# Altium schematic symbol library Kondensator_DIP.SchLib: 1521 symbols (part 2 of 4) (continued)
## Ê50-29-100Â-33ÌÊÔ
designator C?  (value not drawn)
Value: *
footprint K50-29(0820)
pins: 1, 2

## Ê50-29-100Â-47ÌÊÔ
designator C?  (value not drawn)
Value: *
footprint K50-29(1021)
pins: 1, 2

## Ê50-29-100Â-220ÌÊÔ
designator C?  (value not drawn)
Value: *
footprint K50-29(1628)
pins: 1, 2

## Ê50-29-100Â-330ÌÊÔ
designator C?  (value not drawn)
Value: *
footprint K50-29(1633)
pins: 1, 2

## Ê50-29-100Â-470ÌÊÔ
designator C?  (value not drawn)
Value: *
footprint K50-29(1836)
pins: 1, 2

## Ê50-29-160Â-0,47ÌÊÔ
designator C?  (value not drawn)
Value: *
footprint K50-29(0613)
pins: 1, 2

## Ê50-29-160Â-1,0ÌÊÔ
designator C?  (value not drawn)
Value: *
footprint K50-29(0613)
pins: 1, 2

## Ê50-29-160Â-2,2ÌÊÔ
designator C?  (value not drawn)
Value: *
footprint K50-29(0816)
pins: 1, 2

## Ê50-29-160Â-3,3ÌÊÔ
designator C?  (value not drawn)
Value: *
footprint K50-29(0816)
pins: 1, 2

## Ê50-29-160Â-4,7ÌÊÔ
designator C?  (value not drawn)
Value: *
footprint K50-29(0816)
pins: 1, 2

## Ê50-29-160Â-10ÌÊÔ
designator C?  (value not drawn)
Value: *
footprint K50-29(1021)
pins: 1, 2

## Ê50-29-160Â-47ÌÊÔ
designator C?  (value not drawn)
Value: *
footprint K50-29(1628)
pins: 1, 2

## Ê50-29-160Â-100ÌÊÔ
designator C?  (value not drawn)
Value: *
footprint K50-29(1633)
pins: 1, 2

## Ê50-29-160Â-220ÌÊÔ
designator C?  (value not drawn)
Value: *
footprint K50-29(2242)
pins: 1, 2

## Ê50-29-160Â-330ÌÊÔ
designator C?  (value not drawn)
Value: *
footprint K50-29(2250)
pins: 1, 2

## Ê50-29-200Â-0,47ÌÊÔ
designator C?  (value not drawn)
Value: *
footprint K50-29(0816)
pins: 1, 2

## Ê50-29-200Â-1,0ÌÊÔ
designator C?  (value not drawn)
Value: *
footprint K50-29(0816)
pins: 1, 2

## Ê50-29-200Â-2,2ÌÊÔ
designator C?  (value not drawn)
Value: *
footprint K50-29(0816)
pins: 1, 2

## Ê50-29-200Â-3,3ÌÊÔ
designator C?  (value not drawn)
Value: *
footprint K50-29(1016)
pins: 1, 2

## Ê50-29-200Â-4,7ÌÊÔ
designator C?  (value not drawn)
Value: *
footprint K50-29(1016)
pins: 1, 2

## Ê50-29-200Â-10ÌÊÔ
designator C?  (value not drawn)
Value: *
footprint K50-29(1021)
pins: 1, 2

## Ê50-29-200Â-33ÌÊÔ
designator C?  (value not drawn)
Value: *
footprint K50-29(1628)
pins: 1, 2

## Ê50-29-200Â-47ÌÊÔ
designator C?  (value not drawn)
Value: *
footprint K50-29(1633)
pins: 1, 2

## Ê50-29-200Â-100ÌÊÔ
designator C?  (value not drawn)
Value: *
footprint K50-29(1836)
pins: 1, 2

## Ê50-29-200Â-220ÌÊÔ
designator C?  (value not drawn)
Value: *
footprint K50-29(2242)
pins: 1, 2

## Ê50-29-200Â-330ÌÊÔ
designator C?  (value not drawn)
Value: *
footprint K50-29(2552)
pins: 1, 2

## Ê50-29-250Â-0,47ÌÊÔ
designator C?  (value not drawn)
Value: *
footprint K50-29(0816)
pins: 1, 2

## Ê50-29-250Â-1,0ÌÊÔ
designator C?  (value not drawn)
Value: *
footprint K50-29(0816)
pins: 1, 2

## Ê50-29-250Â-2,2ÌÊÔ
designator C?  (value not drawn)
Value: *
footprint K50-29(0816)
pins: 1, 2

## Ê50-29-250Â-3,3ÌÊÔ
designator C?  (value not drawn)
Value: *
footprint K50-29(1016)
pins: 1, 2

## Ê50-29-250Â-4,7ÌÊÔ
designator C?  (value not drawn)
Value: *
footprint K50-29(1016)
pins: 1, 2

## Ê50-29-250Â-10ÌÊÔ
designator C?  (value not drawn)
Value: *
footprint K50-29(1021)
pins: 1, 2

## Ê50-29-250Â-22ÌÊÔ
designator C?  (value not drawn)
Value: *
footprint K50-29(1326)
pins: 1, 2

## Ê50-29-250Â-33ÌÊÔ
designator C?  (value not drawn)
Value: *
footprint K50-29(1633)
pins: 1, 2

## Ê50-29-250Â-47ÌÊÔ
designator C?  (value not drawn)
Value: *
footprint K50-29(1633)
pins: 1, 2

## Ê50-29-250Â-100ÌÊÔ
designator C?  (value not drawn)
Value: *
footprint K50-29(1836)
pins: 1, 2

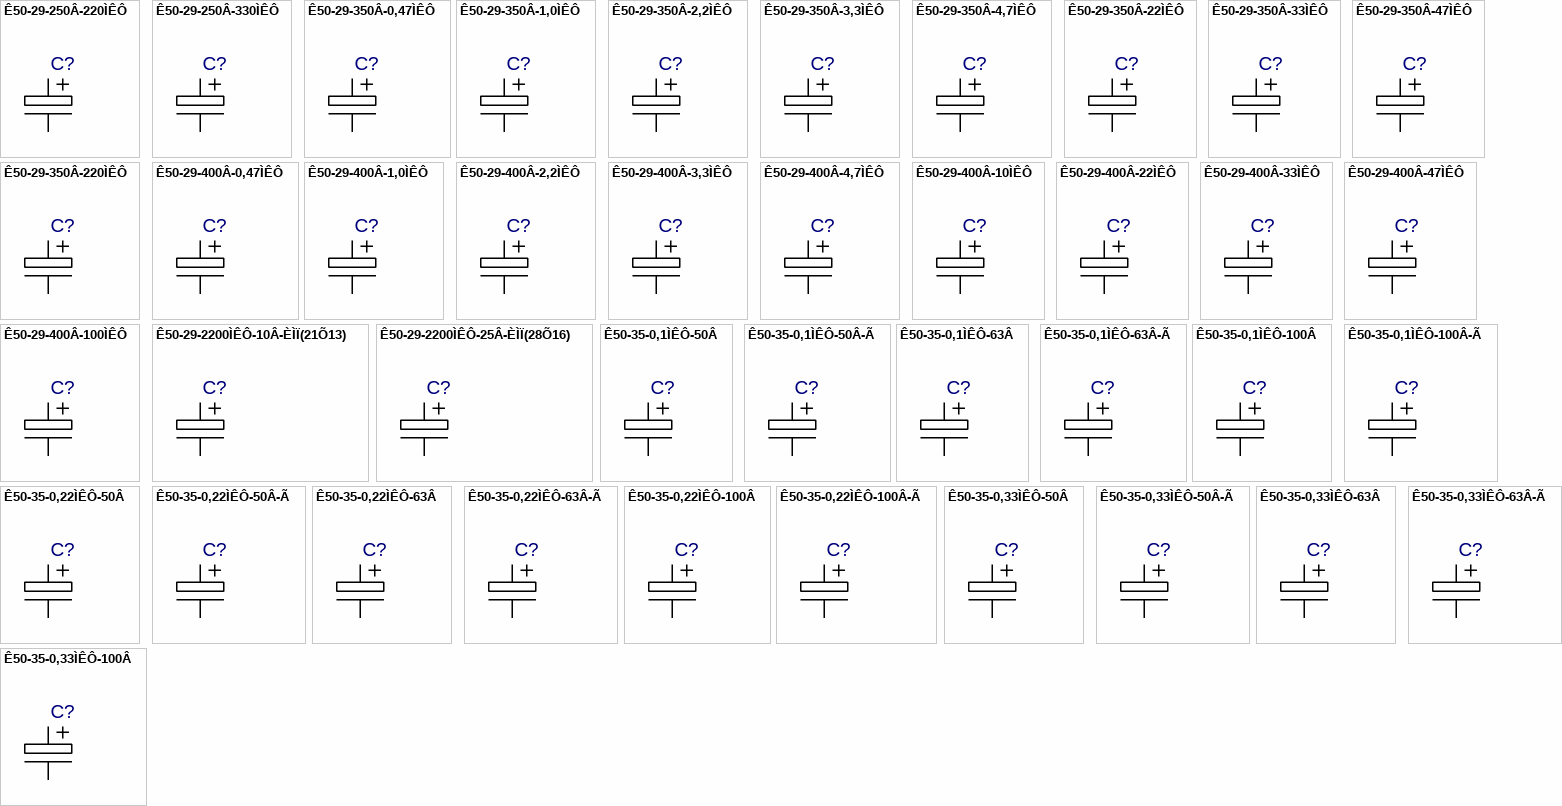
[diagram p20: symbols Ê50-29-250Â-220ÌÊÔ to Ê50-35-0,33ÌÊÔ-100Â]

## Ê50-29-250Â-220ÌÊÔ
designator C?  (value not drawn)
Value: *
footprint K50-29(2242)
pins: 1, 2

## Ê50-29-250Â-330ÌÊÔ
designator C?  (value not drawn)
Value: *
footprint K50-29(2557)
pins: 1, 2

## Ê50-29-350Â-0,47ÌÊÔ
designator C?  (value not drawn)
Value: *
footprint K50-29(0816)
pins: 1, 2

## Ê50-29-350Â-1,0ÌÊÔ
designator C?  (value not drawn)
Value: *
footprint K50-29(0816)
pins: 1, 2

## Ê50-29-350Â-2,2ÌÊÔ
designator C?  (value not drawn)
Value: *
footprint K50-29(1016)
pins: 1, 2

## Ê50-29-350Â-3,3ÌÊÔ
designator C?  (value not drawn)
Value: *
footprint K50-29(1016)
pins: 1, 2

## Ê50-29-350Â-4,7ÌÊÔ
designator C?  (value not drawn)
Value: *
footprint K50-29(1021)
pins: 1, 2

## Ê50-29-350Â-22ÌÊÔ
designator C?  (value not drawn)
Value: *
footprint K50-29(1633)
pins: 1, 2

## Ê50-29-350Â-33ÌÊÔ
designator C?  (value not drawn)
Value: *
footprint K50-29(1633)
pins: 1, 2

## Ê50-29-350Â-47ÌÊÔ
designator C?  (value not drawn)
Value: *
footprint K50-29(1636)
pins: 1, 2

## Ê50-29-350Â-220ÌÊÔ
designator C?  (value not drawn)
Value: *
footprint K50-29(2557)
pins: 1, 2

## Ê50-29-400Â-0,47ÌÊÔ
designator C?  (value not drawn)
Value: *
footprint K50-29(0816)
pins: 1, 2

## Ê50-29-400Â-1,0ÌÊÔ
designator C?  (value not drawn)
Value: *
footprint K50-29(0816)
pins: 1, 2

## Ê50-29-400Â-2,2ÌÊÔ
designator C?  (value not drawn)
Value: *
footprint K50-29(1016)
pins: 1, 2

## Ê50-29-400Â-3,3ÌÊÔ
designator C?  (value not drawn)
Value: *
footprint K50-29(1021)
pins: 1, 2

## Ê50-29-400Â-4,7ÌÊÔ
designator C?  (value not drawn)
Value: *
footprint K50-29(1321)
pins: 1, 2

## Ê50-29-400Â-10ÌÊÔ
designator C?  (value not drawn)
Value: *
footprint K50-29(1324)
pins: 1, 2

## Ê50-29-400Â-22ÌÊÔ
designator C?  (value not drawn)
Value: *
footprint K50-29(1633)
pins: 1, 2

## Ê50-29-400Â-33ÌÊÔ
designator C?  (value not drawn)
Value: *
footprint K50-29(1836)
pins: 1, 2

## Ê50-29-400Â-47ÌÊÔ
designator C?  (value not drawn)
Value: *
footprint K50-29(1836)
pins: 1, 2

## Ê50-29-400Â-100ÌÊÔ
designator C?  (value not drawn)
Value: *
footprint K50-29(2242)
pins: 1, 2

## Ê50-29-2200ÌÊÔ-10Â-ÈÌÏ(21Õ13)
designator C?  (value not drawn)
Value: *
footprint Ê50-29-21Õ13
pins: 1, 2

## Ê50-29-2200ÌÊÔ-25Â-ÈÌÏ(28Õ16)
designator C?  (value not drawn)
Value: *
footprint Ê50-29-28Õ16
pins: 1, 2

## Ê50-35-0,1ÌÊÔ-50Â
designator C?  (value not drawn)
Value: *
footprint Ê50-35-0511_K5035-1R
footprint Ê50-35-0511_K5035-1R1
footprint Ê50-35-0511_Primary
pins: 1, 2

## Ê50-35-0,1ÌÊÔ-50Â-Ã
designator C?  (value not drawn)
Value: *
footprint Ê50-35-0511-Ã_K5035-1R
footprint Ê50-35-0511-Ã_K5035-1R1
footprint Ê50-35-0511-Ã_Primary
pins: 1, 2

## Ê50-35-0,1ÌÊÔ-63Â
designator C?  (value not drawn)
Value: *
footprint Ê50-35-0511_K5035-1R
footprint Ê50-35-0511_K5035-1R1
footprint Ê50-35-0511_Primary
pins: 1, 2

## Ê50-35-0,1ÌÊÔ-63Â-Ã
designator C?  (value not drawn)
Value: *
footprint Ê50-35-0511-Ã_K5035-1R
footprint Ê50-35-0511-Ã_K5035-1R1
footprint Ê50-35-0511-Ã_Primary
pins: 1, 2

## Ê50-35-0,1ÌÊÔ-100Â
designator C?  (value not drawn)
Value: *
footprint Ê50-35-0511_K5035-1R
footprint Ê50-35-0511_K5035-1R1
footprint Ê50-35-0511_Primary
pins: 1, 2

## Ê50-35-0,1ÌÊÔ-100Â-Ã
designator C?  (value not drawn)
Value: *
footprint Ê50-35-0511-Ã_K5035-1R
footprint Ê50-35-0511-Ã_K5035-1R1
footprint Ê50-35-0511-Ã_Primary
pins: 1, 2

## Ê50-35-0,22ÌÊÔ-50Â
designator C?  (value not drawn)
Value: *
footprint Ê50-35-0511_K5035-1R
footprint Ê50-35-0511_K5035-1R1
footprint Ê50-35-0511_Primary
pins: 1, 2

## Ê50-35-0,22ÌÊÔ-50Â-Ã
designator C?  (value not drawn)
Value: *
footprint Ê50-35-0511-Ã_K5035-1R
footprint Ê50-35-0511-Ã_K5035-1R1
footprint Ê50-35-0511-Ã_Primary
pins: 1, 2

## Ê50-35-0,22ÌÊÔ-63Â
designator C?  (value not drawn)
Value: *
footprint Ê50-35-0511_K5035-1R
footprint Ê50-35-0511_K5035-1R1
footprint Ê50-35-0511_Primary
pins: 1, 2

## Ê50-35-0,22ÌÊÔ-63Â-Ã
designator C?  (value not drawn)
Value: *
footprint Ê50-35-0511-Ã_K5035-1R
footprint Ê50-35-0511-Ã_K5035-1R1
footprint Ê50-35-0511-Ã_Primary
pins: 1, 2

## Ê50-35-0,22ÌÊÔ-100Â
designator C?  (value not drawn)
Value: *
footprint Ê50-35-0511_K5035-1R
footprint Ê50-35-0511_K5035-1R1
footprint Ê50-35-0511_Primary
pins: 1, 2

## Ê50-35-0,22ÌÊÔ-100Â-Ã
designator C?  (value not drawn)
Value: *
footprint Ê50-35-0511-Ã_K5035-1R
footprint Ê50-35-0511-Ã_K5035-1R1
footprint Ê50-35-0511-Ã_Primary
pins: 1, 2

## Ê50-35-0,33ÌÊÔ-50Â
designator C?  (value not drawn)
Value: *
footprint Ê50-35-0511_K5035-1R
footprint Ê50-35-0511_K5035-1R1
footprint Ê50-35-0511_Primary
pins: 1, 2

## Ê50-35-0,33ÌÊÔ-50Â-Ã
designator C?  (value not drawn)
Value: *
footprint Ê50-35-0511-Ã_K5035-1R
footprint Ê50-35-0511-Ã_K5035-1R1
footprint Ê50-35-0511-Ã_Primary
pins: 1, 2

## Ê50-35-0,33ÌÊÔ-63Â
designator C?  (value not drawn)
Value: *
footprint Ê50-35-0511_K5035-1R
footprint Ê50-35-0511_K5035-1R1
footprint Ê50-35-0511_Primary
pins: 1, 2

## Ê50-35-0,33ÌÊÔ-63Â-Ã
designator C?  (value not drawn)
Value: *
footprint Ê50-35-0511-Ã_K5035-1R
footprint Ê50-35-0511-Ã_K5035-1R1
footprint Ê50-35-0511-Ã_Primary
pins: 1, 2

## Ê50-35-0,33ÌÊÔ-100Â
designator C?  (value not drawn)
Value: *
footprint Ê50-35-0511_K5035-1R
footprint Ê50-35-0511_K5035-1R1
footprint Ê50-35-0511_Primary
pins: 1, 2

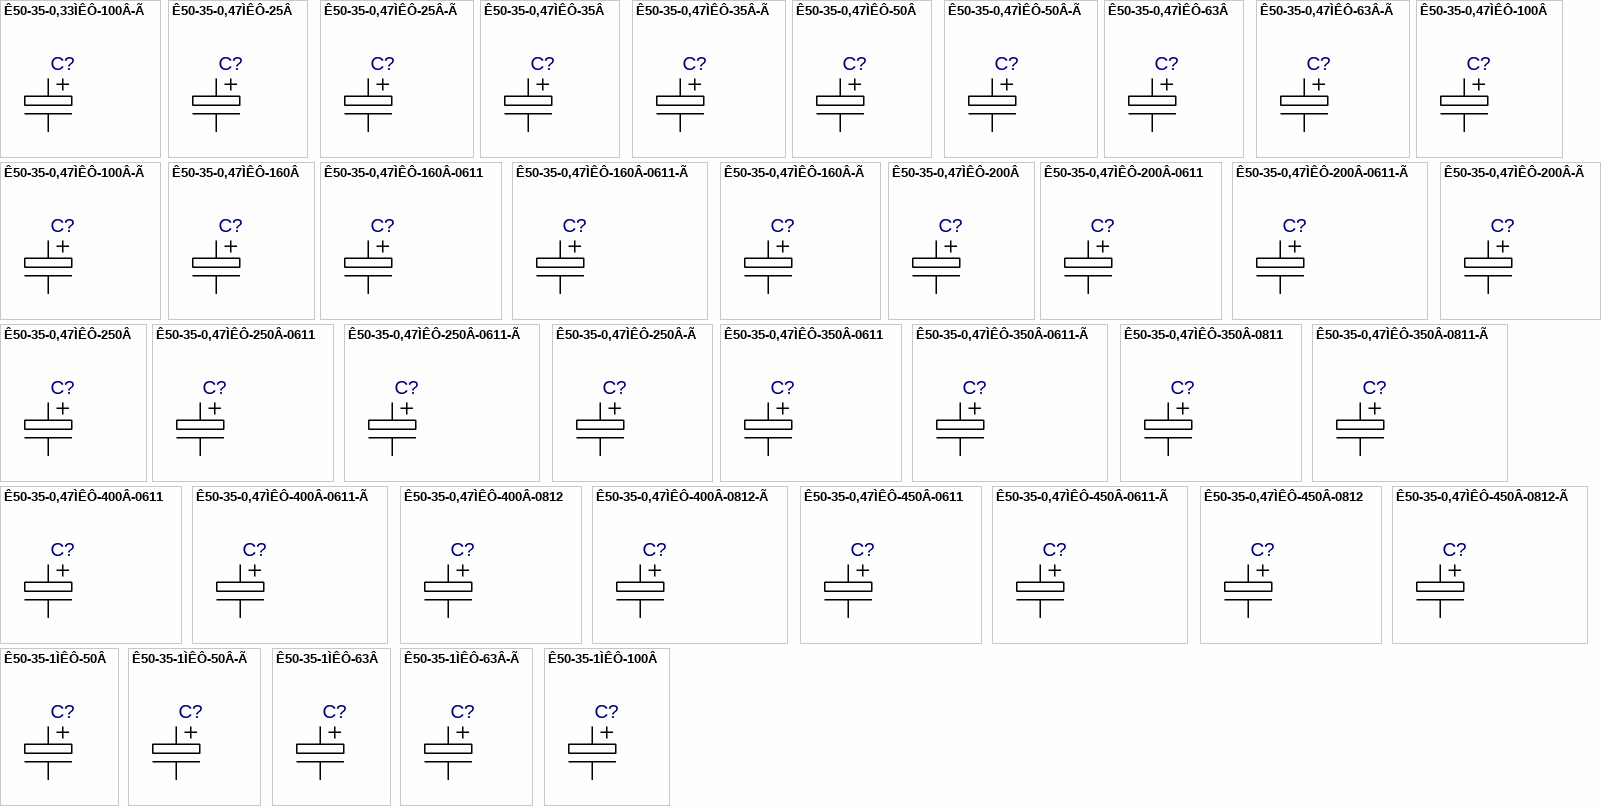
[diagram p21: symbols Ê50-35-0,33ÌÊÔ-100Â-Ã to Ê50-35-1ÌÊÔ-100Â]

## Ê50-35-0,33ÌÊÔ-100Â-Ã
designator C?  (value not drawn)
Value: *
footprint Ê50-35-0511-Ã_K5035-1R
footprint Ê50-35-0511-Ã_K5035-1R1
footprint Ê50-35-0511-Ã_Primary
pins: 1, 2

## Ê50-35-0,47ÌÊÔ-25Â
designator C?  (value not drawn)
Value: *
footprint Ê50-35-0511_K5035-1R
footprint Ê50-35-0511_K5035-1R1
footprint Ê50-35-0511_Primary
pins: 1, 2

## Ê50-35-0,47ÌÊÔ-25Â-Ã
designator C?  (value not drawn)
Value: *
footprint Ê50-35-0511-Ã_K5035-1R
footprint Ê50-35-0511-Ã_K5035-1R1
footprint Ê50-35-0511-Ã_Primary
pins: 1, 2

## Ê50-35-0,47ÌÊÔ-35Â
designator C?  (value not drawn)
Value: *
footprint Ê50-35-0511_K5035-1R
footprint Ê50-35-0511_K5035-1R1
footprint Ê50-35-0511_Primary
pins: 1, 2

## Ê50-35-0,47ÌÊÔ-35Â-Ã
designator C?  (value not drawn)
Value: *
footprint Ê50-35-0511-Ã_K5035-1R
footprint Ê50-35-0511-Ã_K5035-1R1
footprint Ê50-35-0511-Ã_Primary
pins: 1, 2

## Ê50-35-0,47ÌÊÔ-50Â
designator C?  (value not drawn)
Value: *
footprint Ê50-35-0511_K5035-1R
footprint Ê50-35-0511_K5035-1R1
footprint Ê50-35-0511_Primary
pins: 1, 2

## Ê50-35-0,47ÌÊÔ-50Â-Ã
designator C?  (value not drawn)
Value: *
footprint Ê50-35-0511-Ã_K5035-1R
footprint Ê50-35-0511-Ã_K5035-1R1
footprint Ê50-35-0511-Ã_Primary
pins: 1, 2

## Ê50-35-0,47ÌÊÔ-63Â
designator C?  (value not drawn)
Value: *
footprint Ê50-35-0511_K5035-1R
footprint Ê50-35-0511_K5035-1R1
footprint Ê50-35-0511_Primary
pins: 1, 2

## Ê50-35-0,47ÌÊÔ-63Â-Ã
designator C?  (value not drawn)
Value: *
footprint Ê50-35-0511-Ã_K5035-1R
footprint Ê50-35-0511-Ã_K5035-1R1
footprint Ê50-35-0511-Ã_Primary
pins: 1, 2

## Ê50-35-0,47ÌÊÔ-100Â
designator C?  (value not drawn)
Value: *
footprint Ê50-35-0511_K5035-1R
footprint Ê50-35-0511_K5035-1R1
footprint Ê50-35-0511_Primary
pins: 1, 2

## Ê50-35-0,47ÌÊÔ-100Â-Ã
designator C?  (value not drawn)
Value: *
footprint Ê50-35-0511-Ã_K5035-1R
footprint Ê50-35-0511-Ã_K5035-1R1
footprint Ê50-35-0511-Ã_Primary
pins: 1, 2

## Ê50-35-0,47ÌÊÔ-160Â
designator C?  (value not drawn)
Value: *
footprint Ê50-35-0511_K5035-1R
footprint Ê50-35-0511_K5035-1R1
footprint Ê50-35-0511_Primary
pins: 1, 2

## Ê50-35-0,47ÌÊÔ-160Â-0611
designator C?  (value not drawn)
Value: *
footprint Ê50-35-0611_K5035-1R
footprint Ê50-35-0611_K5035-1R1
footprint Ê50-35-0611_Primary
pins: 1, 2

## Ê50-35-0,47ÌÊÔ-160Â-0611-Ã
designator C?  (value not drawn)
Value: *
footprint Ê50-35-0611-Ã_K5035-1R
footprint Ê50-35-0611-Ã_K5035-1R1
footprint Ê50-35-0611-Ã_Primary
pins: 1, 2

## Ê50-35-0,47ÌÊÔ-160Â-Ã
designator C?  (value not drawn)
Value: *
footprint Ê50-35-0511-Ã_K5035-1R
footprint Ê50-35-0511-Ã_K5035-1R1
footprint Ê50-35-0511-Ã_Primary
pins: 1, 2

## Ê50-35-0,47ÌÊÔ-200Â
designator C?  (value not drawn)
Value: *
footprint Ê50-35-0511_K5035-1R
footprint Ê50-35-0511_K5035-1R1
footprint Ê50-35-0511_Primary
pins: 1, 2

## Ê50-35-0,47ÌÊÔ-200Â-0611
designator C?  (value not drawn)
Value: *
footprint Ê50-35-0611_K5035-1R
footprint Ê50-35-0611_K5035-1R1
footprint Ê50-35-0611_Primary
pins: 1, 2

## Ê50-35-0,47ÌÊÔ-200Â-0611-Ã
designator C?  (value not drawn)
Value: *
footprint Ê50-35-0611-Ã_K5035-1R
footprint Ê50-35-0611-Ã_K5035-1R1
footprint Ê50-35-0611-Ã_Primary
pins: 1, 2

## Ê50-35-0,47ÌÊÔ-200Â-Ã
designator C?  (value not drawn)
Value: *
footprint Ê50-35-0511-Ã_K5035-1R
footprint Ê50-35-0511-Ã_K5035-1R1
footprint Ê50-35-0511-Ã_Primary
pins: 1, 2

## Ê50-35-0,47ÌÊÔ-250Â
designator C?  (value not drawn)
Value: *
footprint Ê50-35-0511_K5035-1R
footprint Ê50-35-0511_K5035-1R1
footprint Ê50-35-0511_Primary
pins: 1, 2

## Ê50-35-0,47ÌÊÔ-250Â-0611
designator C?  (value not drawn)
Value: *
footprint Ê50-35-0611_K5035-1R
footprint Ê50-35-0611_K5035-1R1
footprint Ê50-35-0611_Primary
pins: 1, 2

## Ê50-35-0,47ÌÊÔ-250Â-0611-Ã
designator C?  (value not drawn)
Value: *
footprint Ê50-35-0611-Ã_K5035-1R
footprint Ê50-35-0611-Ã_K5035-1R1
footprint Ê50-35-0611-Ã_Primary
pins: 1, 2

## Ê50-35-0,47ÌÊÔ-250Â-Ã
designator C?  (value not drawn)
Value: *
footprint Ê50-35-0511-Ã_K5035-1R
footprint Ê50-35-0511-Ã_K5035-1R1
footprint Ê50-35-0511-Ã_Primary
pins: 1, 2

## Ê50-35-0,47ÌÊÔ-350Â-0611
designator C?  (value not drawn)
Value: *
footprint Ê50-35-0611_K5035-1R
footprint Ê50-35-0611_K5035-1R1
footprint Ê50-35-0611_Primary
pins: 1, 2

## Ê50-35-0,47ÌÊÔ-350Â-0611-Ã
designator C?  (value not drawn)
Value: *
footprint Ê50-35-0611-Ã_K5035-1R
footprint Ê50-35-0611-Ã_K5035-1R1
footprint Ê50-35-0611-Ã_Primary
pins: 1, 2

## Ê50-35-0,47ÌÊÔ-350Â-0811
designator C?  (value not drawn)
Value: *
footprint R50-35-08XX_K5035-2R
footprint R50-35-08XX_K5035-2R1
footprint R50-35-08XX_Primary
pins: 1, 2

## Ê50-35-0,47ÌÊÔ-350Â-0811-Ã
designator C?  (value not drawn)
Value: *
footprint Ê50-35-08XX-Ã_K5035-2R
footprint Ê50-35-08XX-Ã_K5035-2R1
footprint Ê50-35-08XX-Ã_Primary
pins: 1, 2

## Ê50-35-0,47ÌÊÔ-400Â-0611
designator C?  (value not drawn)
Value: *
footprint Ê50-35-0611_K5035-1R
footprint Ê50-35-0611_K5035-1R1
footprint Ê50-35-0611_Primary
pins: 1, 2

## Ê50-35-0,47ÌÊÔ-400Â-0611-Ã
designator C?  (value not drawn)
Value: *
footprint Ê50-35-0611-Ã_K5035-1R
footprint Ê50-35-0611-Ã_K5035-1R1
footprint Ê50-35-0611-Ã_Primary
pins: 1, 2

## Ê50-35-0,47ÌÊÔ-400Â-0812
designator C?  (value not drawn)
Value: *
footprint R50-35-08XX_K5035-2R
footprint R50-35-08XX_K5035-2R1
footprint R50-35-08XX_Primary
pins: 1, 2

## Ê50-35-0,47ÌÊÔ-400Â-0812-Ã
designator C?  (value not drawn)
Value: *
footprint Ê50-35-08XX-Ã_K5035-2R
footprint Ê50-35-08XX-Ã_K5035-2R1
footprint Ê50-35-08XX-Ã_Primary
pins: 1, 2

## Ê50-35-0,47ÌÊÔ-450Â-0611
designator C?  (value not drawn)
Value: *
footprint Ê50-35-0611_K5035-1R
footprint Ê50-35-0611_K5035-1R1
footprint Ê50-35-0611_Primary
pins: 1, 2

## Ê50-35-0,47ÌÊÔ-450Â-0611-Ã
designator C?  (value not drawn)
Value: *
footprint Ê50-35-0611-Ã_K5035-1R
footprint Ê50-35-0611-Ã_K5035-1R1
footprint Ê50-35-0611-Ã_Primary
pins: 1, 2

## Ê50-35-0,47ÌÊÔ-450Â-0812
designator C?  (value not drawn)
Value: *
footprint R50-35-08XX_K5035-2R
footprint R50-35-08XX_K5035-2R1
footprint R50-35-08XX_Primary
pins: 1, 2

## Ê50-35-0,47ÌÊÔ-450Â-0812-Ã
designator C?  (value not drawn)
Value: *
footprint Ê50-35-08XX-Ã_K5035-2R
footprint Ê50-35-08XX-Ã_K5035-2R1
footprint Ê50-35-08XX-Ã_Primary
pins: 1, 2

## Ê50-35-1ÌÊÔ-50Â
designator C?  (value not drawn)
Value: *
footprint Ê50-35-0511_K5035-1R
footprint Ê50-35-0511_K5035-1R1
footprint Ê50-35-0511_Primary
pins: 1, 2

## Ê50-35-1ÌÊÔ-50Â-Ã
designator C?  (value not drawn)
Value: *
footprint Ê50-35-0511-Ã_K5035-1R
footprint Ê50-35-0511-Ã_K5035-1R1
footprint Ê50-35-0511-Ã_Primary
pins: 1, 2

## Ê50-35-1ÌÊÔ-63Â
designator C?  (value not drawn)
Value: *
footprint Ê50-35-0511_K5035-1R
footprint Ê50-35-0511_K5035-1R1
footprint Ê50-35-0511_Primary
pins: 1, 2

## Ê50-35-1ÌÊÔ-63Â-Ã
designator C?  (value not drawn)
Value: *
footprint Ê50-35-0511-Ã_K5035-1R
footprint Ê50-35-0511-Ã_K5035-1R1
footprint Ê50-35-0511-Ã_Primary
pins: 1, 2

## Ê50-35-1ÌÊÔ-100Â
designator C?  (value not drawn)
Value: *
footprint Ê50-35-0511_K5035-1R
footprint Ê50-35-0511_K5035-1R1
footprint Ê50-35-0511_Primary
pins: 1, 2

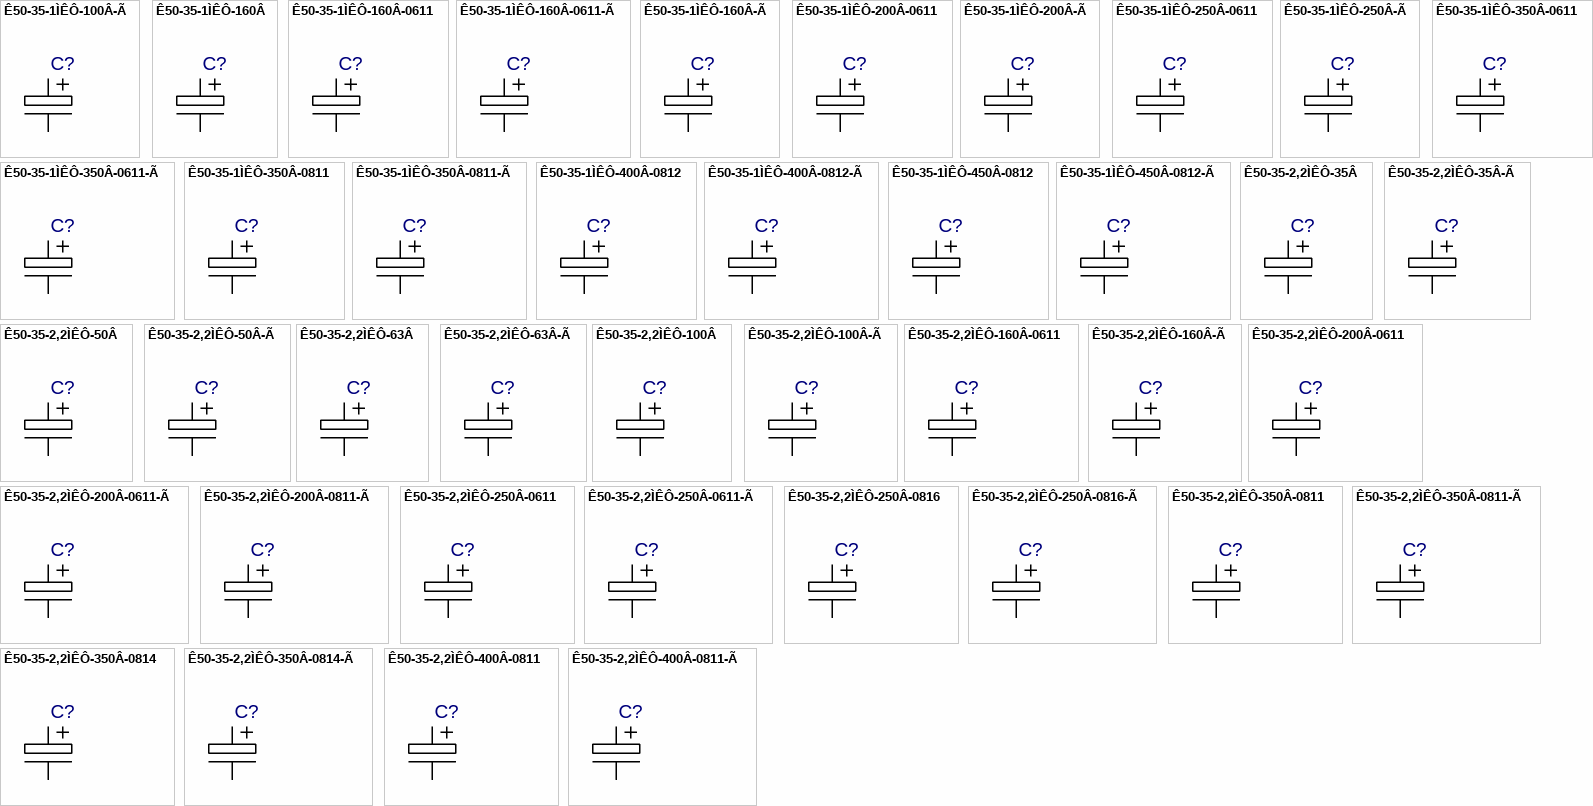
[diagram p22: symbols Ê50-35-1ÌÊÔ-100Â-Ã to Ê50-35-2,2ÌÊÔ-400Â-0811-Ã]

## Ê50-35-1ÌÊÔ-100Â-Ã
designator C?  (value not drawn)
Value: *
footprint Ê50-35-0511-Ã_K5035-1R
footprint Ê50-35-0511-Ã_K5035-1R1
footprint Ê50-35-0511-Ã_Primary
pins: 1, 2

## Ê50-35-1ÌÊÔ-160Â
designator C?  (value not drawn)
Value: *
footprint Ê50-35-0511_K5035-1R
footprint Ê50-35-0511_K5035-1R1
footprint Ê50-35-0511_Primary
pins: 1, 2

## Ê50-35-1ÌÊÔ-160Â-0611
designator C?  (value not drawn)
Value: *
footprint Ê50-35-0611_K5035-1R
footprint Ê50-35-0611_K5035-1R1
footprint Ê50-35-0611_Primary
pins: 1, 2

## Ê50-35-1ÌÊÔ-160Â-0611-Ã
designator C?  (value not drawn)
Value: *
footprint Ê50-35-0611-Ã_K5035-1R
footprint Ê50-35-0611-Ã_K5035-1R1
footprint Ê50-35-0611-Ã_Primary
pins: 1, 2

## Ê50-35-1ÌÊÔ-160Â-Ã
designator C?  (value not drawn)
Value: *
footprint Ê50-35-0511-Ã_K5035-1R
footprint Ê50-35-0511-Ã_K5035-1R1
footprint Ê50-35-0511-Ã_Primary
pins: 1, 2

## Ê50-35-1ÌÊÔ-200Â-0611
designator C?  (value not drawn)
Value: *
footprint Ê50-35-0611_K5035-1R
footprint Ê50-35-0611_K5035-1R1
footprint Ê50-35-0611_Primary
pins: 1, 2

## Ê50-35-1ÌÊÔ-200Â-Ã
designator C?  (value not drawn)
Value: *
footprint Ê50-35-0611-Ã_K5035-1R
footprint Ê50-35-0611-Ã_K5035-1R1
footprint Ê50-35-0611-Ã_Primary
pins: 1, 2

## Ê50-35-1ÌÊÔ-250Â-0611
designator C?  (value not drawn)
Value: *
footprint Ê50-35-0611_K5035-1R
footprint Ê50-35-0611_K5035-1R1
footprint Ê50-35-0611_Primary
pins: 1, 2

## Ê50-35-1ÌÊÔ-250Â-Ã
designator C?  (value not drawn)
Value: *
footprint Ê50-35-0611-Ã_K5035-1R
footprint Ê50-35-0611-Ã_K5035-1R1
footprint Ê50-35-0611-Ã_Primary
pins: 1, 2

## Ê50-35-1ÌÊÔ-350Â-0611
designator C?  (value not drawn)
Value: *
footprint Ê50-35-0611_K5035-1R
footprint Ê50-35-0611_K5035-1R1
footprint Ê50-35-0611_Primary
pins: 1, 2

## Ê50-35-1ÌÊÔ-350Â-0611-Ã
designator C?  (value not drawn)
Value: *
footprint Ê50-35-0611-Ã_K5035-1R
footprint Ê50-35-0611-Ã_K5035-1R1
footprint Ê50-35-0611-Ã_Primary
pins: 1, 2

## Ê50-35-1ÌÊÔ-350Â-0811
designator C?  (value not drawn)
Value: *
footprint R50-35-08XX_K5035-2R
footprint R50-35-08XX_K5035-2R1
footprint R50-35-08XX_Primary
pins: 1, 2

## Ê50-35-1ÌÊÔ-350Â-0811-Ã
designator C?  (value not drawn)
Value: *
footprint Ê50-35-08XX-Ã_K5035-2R
footprint Ê50-35-08XX-Ã_K5035-2R1
footprint Ê50-35-08XX-Ã_Primary
pins: 1, 2

## Ê50-35-1ÌÊÔ-400Â-0812
designator C?  (value not drawn)
Value: *
footprint R50-35-08XX_K5035-2R
footprint R50-35-08XX_K5035-2R1
footprint R50-35-08XX_Primary
pins: 1, 2

## Ê50-35-1ÌÊÔ-400Â-0812-Ã
designator C?  (value not drawn)
Value: *
footprint Ê50-35-08XX-Ã_K5035-2R
footprint Ê50-35-08XX-Ã_K5035-2R1
footprint Ê50-35-08XX-Ã_Primary
pins: 1, 2

## Ê50-35-1ÌÊÔ-450Â-0812
designator C?  (value not drawn)
Value: *
footprint R50-35-08XX_K5035-2R
footprint R50-35-08XX_K5035-2R1
footprint R50-35-08XX_Primary
pins: 1, 2

## Ê50-35-1ÌÊÔ-450Â-0812-Ã
designator C?  (value not drawn)
Value: *
footprint Ê50-35-08XX-Ã_K5035-2R
footprint Ê50-35-08XX-Ã_K5035-2R1
footprint Ê50-35-08XX-Ã_Primary
pins: 1, 2

## Ê50-35-2,2ÌÊÔ-35Â
designator C?  (value not drawn)
Value: *
footprint Ê50-35-0511_K5035-1R
footprint Ê50-35-0511_K5035-1R1
footprint Ê50-35-0511_Primary
pins: 1, 2

## Ê50-35-2,2ÌÊÔ-35Â-Ã
designator C?  (value not drawn)
Value: *
footprint Ê50-35-0511-Ã_K5035-1R
footprint Ê50-35-0511-Ã_K5035-1R1
footprint Ê50-35-0511-Ã_Primary
pins: 1, 2

## Ê50-35-2,2ÌÊÔ-50Â
designator C?  (value not drawn)
Value: *
footprint Ê50-35-0511_K5035-1R
footprint Ê50-35-0511_K5035-1R1
footprint Ê50-35-0511_Primary
pins: 1, 2

## Ê50-35-2,2ÌÊÔ-50Â-Ã
designator C?  (value not drawn)
Value: *
footprint Ê50-35-0511-Ã_K5035-1R
footprint Ê50-35-0511-Ã_K5035-1R1
footprint Ê50-35-0511-Ã_Primary
pins: 1, 2

## Ê50-35-2,2ÌÊÔ-63Â
designator C?  (value not drawn)
Value: *
footprint Ê50-35-0511_K5035-1R
footprint Ê50-35-0511_K5035-1R1
footprint Ê50-35-0511_Primary
pins: 1, 2

## Ê50-35-2,2ÌÊÔ-63Â-Ã
designator C?  (value not drawn)
Value: *
footprint Ê50-35-0511-Ã_K5035-1R
footprint Ê50-35-0511-Ã_K5035-1R1
footprint Ê50-35-0511-Ã_Primary
pins: 1, 2

## Ê50-35-2,2ÌÊÔ-100Â
designator C?  (value not drawn)
Value: *
footprint Ê50-35-0511_K5035-1R
footprint Ê50-35-0511_K5035-1R1
footprint Ê50-35-0511_Primary
pins: 1, 2

## Ê50-35-2,2ÌÊÔ-100Â-Ã
designator C?  (value not drawn)
Value: *
footprint Ê50-35-0511-Ã_K5035-1R
footprint Ê50-35-0511-Ã_K5035-1R1
footprint Ê50-35-0511-Ã_Primary
pins: 1, 2

## Ê50-35-2,2ÌÊÔ-160Â-0611
designator C?  (value not drawn)
Value: *
footprint Ê50-35-0611_K5035-1R
footprint Ê50-35-0611_K5035-1R1
footprint Ê50-35-0611_Primary
pins: 1, 2

## Ê50-35-2,2ÌÊÔ-160Â-Ã
designator C?  (value not drawn)
Value: *
footprint Ê50-35-0611-Ã_K5035-1R
footprint Ê50-35-0611-Ã_K5035-1R1
footprint Ê50-35-0611-Ã_Primary
pins: 1, 2

## Ê50-35-2,2ÌÊÔ-200Â-0611
designator C?  (value not drawn)
Value: *
footprint Ê50-35-0611_K5035-1R
footprint Ê50-35-0611_K5035-1R1
footprint Ê50-35-0611_Primary
pins: 1, 2

## Ê50-35-2,2ÌÊÔ-200Â-0611-Ã
designator C?  (value not drawn)
Value: *
footprint Ê50-35-0611-Ã_K5035-1R
footprint Ê50-35-0611-Ã_K5035-1R1
footprint Ê50-35-0611-Ã_Primary
pins: 1, 2

## Ê50-35-2,2ÌÊÔ-200Â-0811-Ã
designator C?  (value not drawn)
Value: *
footprint Ê50-35-08XX-Ã_K5035-2R
footprint Ê50-35-08XX-Ã_K5035-2R1
footprint Ê50-35-08XX-Ã_Primary
pins: 1, 2

## Ê50-35-2,2ÌÊÔ-250Â-0611
designator C?  (value not drawn)
Value: *
footprint Ê50-35-0611_K5035-1R
footprint Ê50-35-0611_K5035-1R1
footprint Ê50-35-0611_Primary
pins: 1, 2

## Ê50-35-2,2ÌÊÔ-250Â-0611-Ã
designator C?  (value not drawn)
Value: *
footprint Ê50-35-0611-Ã_K5035-1R
footprint Ê50-35-0611-Ã_K5035-1R1
footprint Ê50-35-0611-Ã_Primary
pins: 1, 2

## Ê50-35-2,2ÌÊÔ-250Â-0816
designator C?  (value not drawn)
Value: *
footprint R50-35-08XX_K5035-2R
footprint R50-35-08XX_K5035-2R1
footprint R50-35-08XX_Primary
pins: 1, 2

## Ê50-35-2,2ÌÊÔ-250Â-0816-Ã
designator C?  (value not drawn)
Value: *
footprint Ê50-35-08XX-Ã_K5035-2R
footprint Ê50-35-08XX-Ã_K5035-2R1
footprint Ê50-35-08XX-Ã_Primary
pins: 1, 2

## Ê50-35-2,2ÌÊÔ-350Â-0811
designator C?  (value not drawn)
Value: *
footprint R50-35-08XX_K5035-2R
footprint R50-35-08XX_K5035-2R1
footprint R50-35-08XX_Primary
pins: 1, 2

## Ê50-35-2,2ÌÊÔ-350Â-0811-Ã
designator C?  (value not drawn)
Value: *
footprint Ê50-35-08XX-Ã_K5035-2R
footprint Ê50-35-08XX-Ã_K5035-2R1
footprint Ê50-35-08XX-Ã_Primary
pins: 1, 2

## Ê50-35-2,2ÌÊÔ-350Â-0814
designator C?  (value not drawn)
Value: *
footprint R50-35-08XX_K5035-2R
footprint R50-35-08XX_K5035-2R1
footprint R50-35-08XX_Primary
pins: 1, 2

## Ê50-35-2,2ÌÊÔ-350Â-0814-Ã
designator C?  (value not drawn)
Value: *
footprint Ê50-35-08XX-Ã_K5035-2R
footprint Ê50-35-08XX-Ã_K5035-2R1
footprint Ê50-35-08XX-Ã_Primary
pins: 1, 2

## Ê50-35-2,2ÌÊÔ-400Â-0811
designator C?  (value not drawn)
Value: *
footprint R50-35-08XX_K5035-2R
footprint R50-35-08XX_K5035-2R1
footprint R50-35-08XX_Primary
pins: 1, 2

## Ê50-35-2,2ÌÊÔ-400Â-0811-Ã
designator C?  (value not drawn)
Value: *
footprint Ê50-35-08XX-Ã_K5035-2R
footprint Ê50-35-08XX-Ã_K5035-2R1
footprint Ê50-35-08XX-Ã_Primary
pins: 1, 2

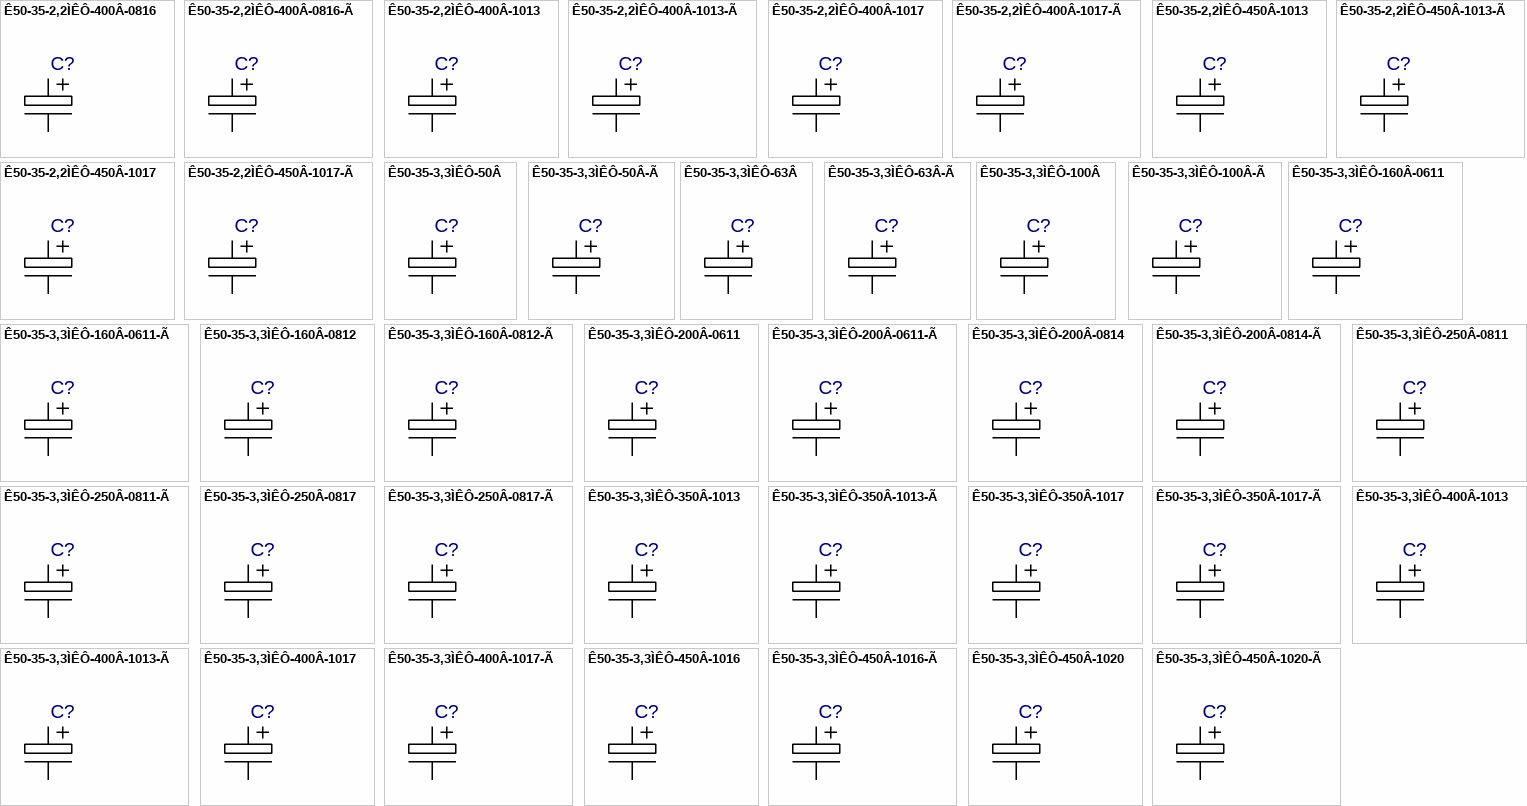
[diagram p23: symbols Ê50-35-2,2ÌÊÔ-400Â-0816 to Ê50-35-3,3ÌÊÔ-450Â-1020-Ã]

## Ê50-35-2,2ÌÊÔ-400Â-0816
designator C?  (value not drawn)
Value: *
footprint R50-35-08XX_K5035-2R
footprint R50-35-08XX_K5035-2R1
footprint R50-35-08XX_Primary
pins: 1, 2

## Ê50-35-2,2ÌÊÔ-400Â-0816-Ã
designator C?  (value not drawn)
Value: *
footprint Ê50-35-08XX-Ã_K5035-2R
footprint Ê50-35-08XX-Ã_K5035-2R1
footprint Ê50-35-08XX-Ã_Primary
pins: 1, 2

## Ê50-35-2,2ÌÊÔ-400Â-1013
designator C?  (value not drawn)
Value: *
footprint Ê50-35-1020_K5035-1R
footprint Ê50-35-1020_K5035-1R1
footprint Ê50-35-1020_Primary
pins: 1, 2

## Ê50-35-2,2ÌÊÔ-400Â-1013-Ã
designator C?  (value not drawn)
Value: *
footprint Ê50-35-1020-Ã_K5035-1R
footprint Ê50-35-1020-Ã_K5035-1R1
footprint Ê50-35-1020-Ã_Primary
pins: 1, 2

## Ê50-35-2,2ÌÊÔ-400Â-1017
designator C?  (value not drawn)
Value: *
footprint Ê50-35-1020_K5035-1R
footprint Ê50-35-1020_K5035-1R1
footprint Ê50-35-1020_Primary
pins: 1, 2

## Ê50-35-2,2ÌÊÔ-400Â-1017-Ã
designator C?  (value not drawn)
Value: *
footprint Ê50-35-1020-Ã_K5035-1R
footprint Ê50-35-1020-Ã_K5035-1R1
footprint Ê50-35-1020-Ã_Primary
pins: 1, 2

## Ê50-35-2,2ÌÊÔ-450Â-1013
designator C?  (value not drawn)
Value: *
footprint Ê50-35-1020_K5035-1R
footprint Ê50-35-1020_K5035-1R1
footprint Ê50-35-1020_Primary
pins: 1, 2

## Ê50-35-2,2ÌÊÔ-450Â-1013-Ã
designator C?  (value not drawn)
Value: *
footprint Ê50-35-1020-Ã_K5035-1R
footprint Ê50-35-1020-Ã_K5035-1R1
footprint Ê50-35-1020-Ã_Primary
pins: 1, 2

## Ê50-35-2,2ÌÊÔ-450Â-1017
designator C?  (value not drawn)
Value: *
footprint Ê50-35-1020_K5035-1R
footprint Ê50-35-1020_K5035-1R1
footprint Ê50-35-1020_Primary
pins: 1, 2

## Ê50-35-2,2ÌÊÔ-450Â-1017-Ã
designator C?  (value not drawn)
Value: *
footprint Ê50-35-1020-Ã_K5035-1R
footprint Ê50-35-1020-Ã_K5035-1R1
footprint Ê50-35-1020-Ã_Primary
pins: 1, 2

## Ê50-35-3,3ÌÊÔ-50Â
designator C?  (value not drawn)
Value: *
footprint Ê50-35-0511_K5035-1R
footprint Ê50-35-0511_K5035-1R1
footprint Ê50-35-0511_Primary
pins: 1, 2

## Ê50-35-3,3ÌÊÔ-50Â-Ã
designator C?  (value not drawn)
Value: *
footprint Ê50-35-0511-Ã_K5035-1R
footprint Ê50-35-0511-Ã_K5035-1R1
footprint Ê50-35-0511-Ã_Primary
pins: 1, 2

## Ê50-35-3,3ÌÊÔ-63Â
designator C?  (value not drawn)
Value: *
footprint Ê50-35-0511_K5035-1R
footprint Ê50-35-0511_K5035-1R1
footprint Ê50-35-0511_Primary
pins: 1, 2

## Ê50-35-3,3ÌÊÔ-63Â-Ã
designator C?  (value not drawn)
Value: *
footprint Ê50-35-0511-Ã_K5035-1R
footprint Ê50-35-0511-Ã_K5035-1R1
footprint Ê50-35-0511-Ã_Primary
pins: 1, 2

## Ê50-35-3,3ÌÊÔ-100Â
designator C?  (value not drawn)
Value: *
footprint Ê50-35-0511_K5035-1R
footprint Ê50-35-0511_K5035-1R1
footprint Ê50-35-0511_Primary
pins: 1, 2

## Ê50-35-3,3ÌÊÔ-100Â-Ã
designator C?  (value not drawn)
Value: *
footprint Ê50-35-0511-Ã_K5035-1R
footprint Ê50-35-0511-Ã_K5035-1R1
footprint Ê50-35-0511-Ã_Primary
pins: 1, 2

## Ê50-35-3,3ÌÊÔ-160Â-0611
designator C?  (value not drawn)
Value: *
footprint Ê50-35-0611_K5035-1R
footprint Ê50-35-0611_K5035-1R1
footprint Ê50-35-0611_Primary
pins: 1, 2

## Ê50-35-3,3ÌÊÔ-160Â-0611-Ã
designator C?  (value not drawn)
Value: *
footprint Ê50-35-0611-Ã_K5035-1R
footprint Ê50-35-0611-Ã_K5035-1R1
footprint Ê50-35-0611-Ã_Primary
pins: 1, 2

## Ê50-35-3,3ÌÊÔ-160Â-0812
designator C?  (value not drawn)
Value: *
footprint R50-35-08XX_K5035-2R
footprint R50-35-08XX_K5035-2R1
footprint R50-35-08XX_Primary
pins: 1, 2

## Ê50-35-3,3ÌÊÔ-160Â-0812-Ã
designator C?  (value not drawn)
Value: *
footprint Ê50-35-08XX-Ã_K5035-2R
footprint Ê50-35-08XX-Ã_K5035-2R1
footprint Ê50-35-08XX-Ã_Primary
pins: 1, 2

## Ê50-35-3,3ÌÊÔ-200Â-0611
designator C?  (value not drawn)
Value: *
footprint Ê50-35-0611_K5035-1R
footprint Ê50-35-0611_K5035-1R1
footprint Ê50-35-0611_Primary
pins: 1, 2

## Ê50-35-3,3ÌÊÔ-200Â-0611-Ã
designator C?  (value not drawn)
Value: *
footprint Ê50-35-0611-Ã_K5035-1R
footprint Ê50-35-0611-Ã_K5035-1R1
footprint Ê50-35-0611-Ã_Primary
pins: 1, 2

## Ê50-35-3,3ÌÊÔ-200Â-0814
designator C?  (value not drawn)
Value: *
footprint R50-35-08XX_K5035-2R
footprint R50-35-08XX_K5035-2R1
footprint R50-35-08XX_Primary
pins: 1, 2

## Ê50-35-3,3ÌÊÔ-200Â-0814-Ã
designator C?  (value not drawn)
Value: *
footprint Ê50-35-08XX-Ã_K5035-2R
footprint Ê50-35-08XX-Ã_K5035-2R1
footprint Ê50-35-08XX-Ã_Primary
pins: 1, 2

## Ê50-35-3,3ÌÊÔ-250Â-0811
designator C?  (value not drawn)
Value: *
footprint R50-35-08XX_K5035-2R
footprint R50-35-08XX_K5035-2R1
footprint R50-35-08XX_Primary
pins: 1, 2

## Ê50-35-3,3ÌÊÔ-250Â-0811-Ã
designator C?  (value not drawn)
Value: *
footprint Ê50-35-08XX-Ã_K5035-2R
footprint Ê50-35-08XX-Ã_K5035-2R1
footprint Ê50-35-08XX-Ã_Primary
pins: 1, 2

## Ê50-35-3,3ÌÊÔ-250Â-0817
designator C?  (value not drawn)
Value: *
footprint R50-35-08XX_K5035-2R
footprint R50-35-08XX_K5035-2R1
footprint R50-35-08XX_Primary
pins: 1, 2

## Ê50-35-3,3ÌÊÔ-250Â-0817-Ã
designator C?  (value not drawn)
Value: *
footprint Ê50-35-08XX-Ã_K5035-2R
footprint Ê50-35-08XX-Ã_K5035-2R1
footprint Ê50-35-08XX-Ã_Primary
pins: 1, 2

## Ê50-35-3,3ÌÊÔ-350Â-1013
designator C?  (value not drawn)
Value: *
footprint Ê50-35-1020_K5035-1R
footprint Ê50-35-1020_K5035-1R1
footprint Ê50-35-1020_Primary
pins: 1, 2

## Ê50-35-3,3ÌÊÔ-350Â-1013-Ã
designator C?  (value not drawn)
Value: *
footprint Ê50-35-1020-Ã_K5035-1R
footprint Ê50-35-1020-Ã_K5035-1R1
footprint Ê50-35-1020-Ã_Primary
pins: 1, 2

## Ê50-35-3,3ÌÊÔ-350Â-1017
designator C?  (value not drawn)
Value: *
footprint Ê50-35-1020_K5035-1R
footprint Ê50-35-1020_K5035-1R1
footprint Ê50-35-1020_Primary
pins: 1, 2

## Ê50-35-3,3ÌÊÔ-350Â-1017-Ã
designator C?  (value not drawn)
Value: *
footprint Ê50-35-1020-Ã_K5035-1R
footprint Ê50-35-1020-Ã_K5035-1R1
footprint Ê50-35-1020-Ã_Primary
pins: 1, 2

## Ê50-35-3,3ÌÊÔ-400Â-1013
designator C?  (value not drawn)
Value: *
footprint Ê50-35-1020_K5035-1R
footprint Ê50-35-1020_K5035-1R1
footprint Ê50-35-1020_Primary
pins: 1, 2

## Ê50-35-3,3ÌÊÔ-400Â-1013-Ã
designator C?  (value not drawn)
Value: *
footprint Ê50-35-1020-Ã_K5035-1R
footprint Ê50-35-1020-Ã_K5035-1R1
footprint Ê50-35-1020-Ã_Primary
pins: 1, 2

## Ê50-35-3,3ÌÊÔ-400Â-1017
designator C?  (value not drawn)
Value: *
footprint Ê50-35-1020_K5035-1R
footprint Ê50-35-1020_K5035-1R1
footprint Ê50-35-1020_Primary
pins: 1, 2

## Ê50-35-3,3ÌÊÔ-400Â-1017-Ã
designator C?  (value not drawn)
Value: *
footprint Ê50-35-1020-Ã_K5035-1R
footprint Ê50-35-1020-Ã_K5035-1R1
footprint Ê50-35-1020-Ã_Primary
pins: 1, 2

## Ê50-35-3,3ÌÊÔ-450Â-1016
designator C?  (value not drawn)
Value: *
footprint Ê50-35-1020_K5035-1R
footprint Ê50-35-1020_K5035-1R1
footprint Ê50-35-1020_Primary
pins: 1, 2

## Ê50-35-3,3ÌÊÔ-450Â-1016-Ã
designator C?  (value not drawn)
Value: *
footprint Ê50-35-1020-Ã_K5035-1R
footprint Ê50-35-1020-Ã_K5035-1R1
footprint Ê50-35-1020-Ã_Primary
pins: 1, 2